# Altium footprint library SwagePCB.PcbLib: 114 footprints (part 4 of 8)
Each footprint in its own frame and in the unit in brackets; x right, y up, seen from the top. Pads: shape width x height; smd on the part's side, far side on the other; paste and mask are expansions set on the pad; w line width, h text height; cw(c..) or ccw(c..) is an arc to the next point about the centre after c.
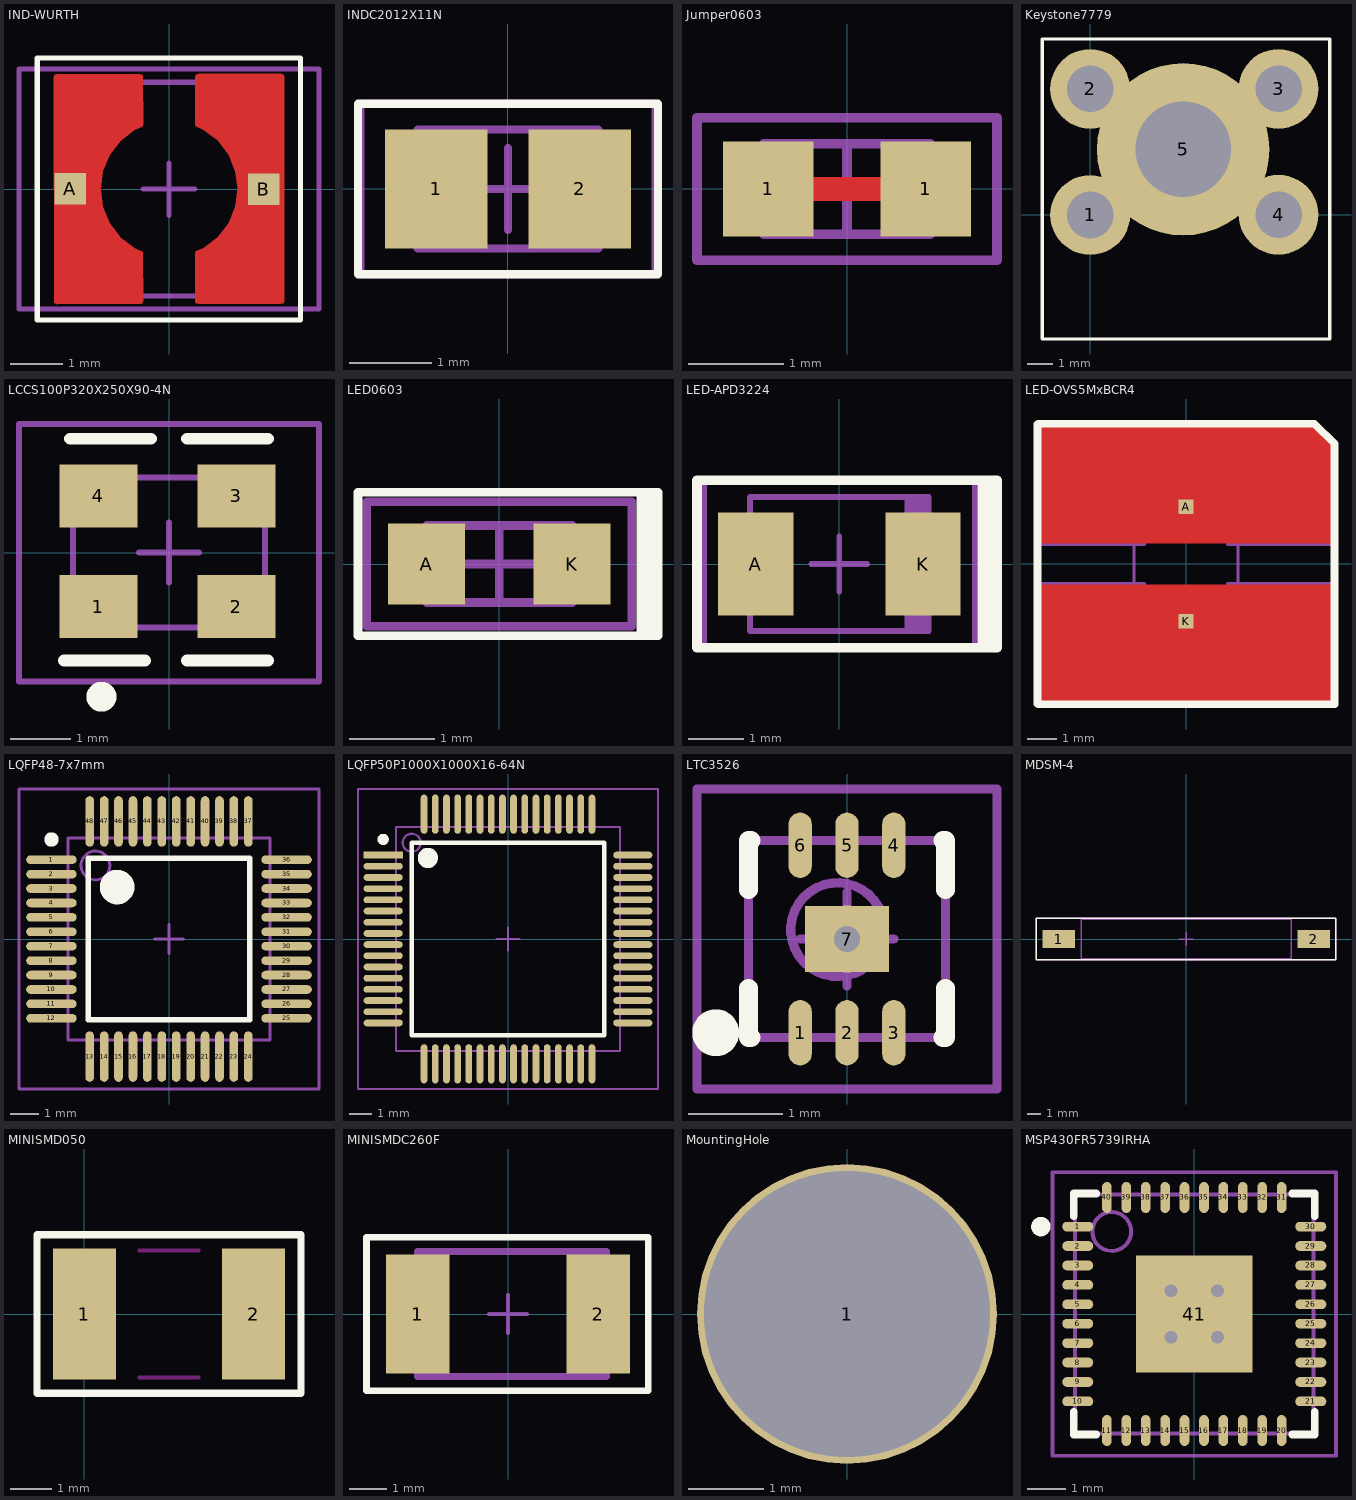
[diagram p3: the footprints below, top view; thin cyan lines are the x and y axes]

## IND-WURTH [mm] "Precision Wire Wound Inductor, 2-Leads, Body 3.8x3.8mm, IPC Medium Density"
height 1.8
pads (2):
  rect 0.6x0.6 smd: A(-1.894,0.006) B(1.818,0)
Top Layer:
  region: 0.505,-2.144 0.501,-1.228 0.517,-1.19 0.52,-1.193 0.517,-1.19 0.518,-1.189 0.536,-1.181 0.536,-1.182 0.661,-1.13 0.933,-0.922 1.141,-0.65 1.272,-0.334 1.317,0.006 1.272,0.345 1.141,0.661 0.933,0.933 0.661,1.141 0.536,1.193 0.517,1.2 0.501,1.24 0.505,1.24 0.501,2.156 0.517,2.195 0.556,2.211 0.556,2.207 2.155,2.211 2.194,2.195 2.195,2.195 2.194,2.195 2.195,2.194 2.195,2.195 2.192,2.191 2.191,2.192 2.195,2.195 2.194,2.195 2.195,2.194 2.195,2.195 2.192,2.191 2.195,2.194 2.211,2.155 2.207,2.155 2.211,-2.145 2.195,-2.184 2.156,-2.2 2.149,-2.197 2.149,-2.195 0.557,-2.2 0.517,-2.183 0.501,-2.144
  region: -2.201,-2.15 -2.205,2.15 -2.189,2.189 -2.186,2.186 -2.188,2.189 -2.149,2.206 -2.149,2.201 -0.55,2.206 -0.511,2.189 -0.494,2.15 -0.499,2.15 -0.494,1.234 -0.511,1.195 -0.529,1.187 -0.529,1.188 -0.654,1.136 -0.926,0.927 -1.134,0.656 -1.265,0.339 -1.31,0 -1.265,-0.339 -1.134,-0.656 -0.926,-0.927 -0.654,-1.136 -0.529,-1.187 -0.511,-1.195 -0.51,-1.196 -0.513,-1.198 -0.51,-1.196 -0.495,-1.234 -0.499,-1.234 -0.495,-2.15 -0.511,-2.189 -0.55,-2.205 -0.55,-2.201 -2.142,-2.203 -2.15,-2.206 -2.189,-2.19 -2.205,-2.15
Top Overlay:
  lines w0.1: -2.522,-2.507 2.521,-2.507 ; -2.522,2.512 2.521,2.512
  lines w0.102: -2.522,-2.507 -2.522,2.512 ; 2.521,-2.507 2.521,2.512
Mechanical 13:
  lines w0.1: -2.05,-2.05 -2.05,2.05 2.05,2.05 2.05,-2.05 -2.05,-2.05
Mechanical 15:
  lines w0.1: -0.5,0 0.5,0 ; 0,-0.5 0,0.5 ; -2.875,-2.3 -2.875,2.3 2.875,2.3 2.875,-2.3 -2.875,-2.3
3D body: height 1.8, standoff 0, extent -2.05,-2.05 2.05,2.05

## INDC2012X11N [mm] "Chip Inductor, 2-Leads, Body 2.0x1.3mm, IPC Medium Density"
height 1.1
pads (2):
  rect 1.25x1.45 smd: 1(-0.875,0) 2(0.875,0)
Top Overlay:
  lines w0.102: -1.829,-1.041 1.829,-1.041 1.829,1.041 -1.829,1.041 -1.829,-1.041
Mechanical 13:
  lines w0.1: -1.1,-0.725 -1.1,0.725 1.1,0.725 1.1,-0.725 -1.1,-0.725
Mechanical 15:
  lines w0.1: -1.778,1.041 1.778,1.041 ; -0.5,0 0.5,0 ; 0,-0.5 0,0.5
  lines w0.102: -1.803,-1.016 -1.803,1.016 ; -1.778,-1.041 1.778,-1.041 ; 1.803,-1.016 1.803,1.016
3D body: height 1.1, standoff 0, extent -1.1,-0.725 1.1,0.725

## Jumper0603 [mm] "Jumper made from an 0603 footprint"
pads (2):
  rect 0.95x1 smd: 1(-0.825,0) 1(0.825,0)
Top Layer:
  lines w0.254: -0.825,0 0.825,0
Mechanical 13:
  lines w0.1: -0.875,-0.475 0.875,-0.475 0.875,0.475 -0.875,0.475 -0.875,-0.475
Mechanical 15:
  lines w0.1: -0.475,0 0.475,0 ; 0,-0.475 0,0.475 ; -1.575,-0.75 1.575,-0.75 1.575,0.75 -1.575,0.75 -1.575,-0.75

## Keystone7779 [mil] "Screw Terminal, Right Angle"
height 279.53
pads (5):
  round 125 hole 73: 1(0,-0.47) 2(0,197) 3(295,197) 4(295,0)
  round 270 hole 150: 5(145.67,102.36)
Top Overlay:
  lines w5: 375.02,274.99 -75.04,275.02 -75.04,-194.61 375.06,-194.61 375.06,274.99
3D body: height 312, standoff -200, extent -56.39,-192.86 352.6,260.27

## LCCS100P320X250X90-4N [mm] "LCC, 4-Pins, Body 3.3x2.6mm (max), Pitch 1.00mm, IPC Medium Density"
height 0.9
pads (4):
  rect 1.3x1.05 smd: 1(-1.175,-0.9) 2(1.125,-0.9) 3(1.125,0.95) 4(-1.175,0.95)
Top Overlay:
  circle w0.25: c-1.125,-2.4 r0.125
  lines w0.2: -1.75,-1.8 -0.4,-1.8 ; -1.65,1.9 -0.3,1.9 ; 0.3,-1.8 1.65,-1.8 ; 0.3,1.9 1.65,1.9
Mechanical 13:
  lines w0.1: -1.6,-1.25 1.6,-1.25 1.6,1.25 -1.6,1.25 -1.6,-1.25
Mechanical 15:
  lines w0.1: -0.5,0 0.5,0 ; 0,-0.5 0,0.5 ; -2.5,-2.15 2.5,-2.15 2.5,2.15 -2.5,2.15 -2.5,-2.15
3D body: height 0.9, standoff 0, extent -1.6,-1.25 1.6,1.25

## LED0603 [mm] "Chip LED, 2-Leads, Body 1.7x0.8mm, IPC Medium Density"
height 0.65
pads (2):
  rect 0.9x0.95 smd: A(-0.85,0) K(0.85,0)
Top Overlay:
  lines w0.102: 1.753,-0.838 1.753,0.838 ; 1.651,-0.838 1.854,-0.838 1.854,0.838 1.651,0.838 ; 1.651,-0.838 1.651,0.838 ; 1.651,-0.838 -1.651,-0.838 -1.651,0.838 1.651,0.838
Mechanical 13:
  lines w0.1: -0.85,-0.45 0.85,-0.45 0.85,0.45 -0.85,0.45 -0.85,-0.45
Mechanical 15:
  lines w0.1: -0.45,0 0.45,0 ; 0,-0.45 0,0.45 ; -1.55,-0.725 1.55,-0.725 1.55,0.725 -1.55,0.725 -1.55,-0.725
3D body: height 0.55, standoff 0, extent -0.85,-0.45 0.85,0.45

## LED-APD3224 [mm] "LED, 2-Leads, Body 3.2x2.4mm, IPC Medium Density"
height 0.7
pads (2):
  rect 1.35x1.85 smd: A(-1.5,0) K(1.5,0)
Top Overlay:
  lines w0.178: 2.567,-1.499 2.567,1.499 ; 2.667,-1.499 2.667,1.499 ; 2.825,1.497 2.825,-1.5 -2.55,-1.5 -2.55,1.5 2.825,1.5
Mechanical 13:
  rectangle: 1.17,-1.2 1.6,1.2
  lines w0.1: -1.6,-1.2 -1.6,1.2 1.6,1.2 1.6,-1.2 -1.6,-1.2
Mechanical 15:
  lines w0.1: -0.5,0 0.5,0 ; 0,-0.5 0,0.5 ; -2.425,-1.5 -2.425,1.5 2.425,1.5 2.425,-1.5 -2.425,-1.5
3D body: height 0.7, standoff 0, extent -1.6,-1.2 1.6,1.2

## LED-OVS5MxBCR4 [mm] "LED, Water Clear Lens, 3.5mm x 3.5mm x 1.2mm"
height 1.2
pads (2):
  rect 0.5x0.5 smd paste+0 mask+0: A(0,1.925) K(0,-1.925)
Top Layer:
  region: -5,0.7 5,0.7 5,4.05 4.35,4.7 -5,4.7
  region: -5,-4.7 5,-4.7 5,-0.7 -5,-0.7
Top Layer keep-out:
  lines w0.127: -5,-0.381 -5,0.377 ; 4.978,-0.381 4.978,0.377
Top Overlay:
  lines w0.254: -5,-4.7 -5,4.7 -4.975,4.725 4.325,4.725 5,4.05 5,-4.725 -4.975,-4.725 -5,-4.7 ; 4.3,4.725 ccw(c4.3,4.725) 4.3,4.725
Top Paste:
  region: 1.4,-0.65 1.4,-2.2 -1.4,-2.2 -1.4,-0.65
  region: -1.4,0.65 -1.4,2.2 -0.25,2.2 0.25,2.2 1.4,2.2 1.4,0.65
Top Solder:
  region: -1.4,0.65 -1.4,3.175 1.4,3.175 1.4,0.65
  region: -1.4,-3.175 1.4,-3.175 1.4,-0.65 -1.4,-0.65
Mechanical 6:
  lines w0.102: 0.225,1.65 0.225,2.2 -0.25,2.2 -0.25,1.65 -1.4,1.65 -1.4,0.65 -5.05,0.65 -5.05,4.75 4.325,4.75 5.05,4.025 5.05,0.65 1.4,0.65 1.4,1.65 0.25,1.65 ; -5.05,-4.75 -5.05,-0.65 -1.4,-0.65 -1.4,-1.65 -0.225,-1.65 -0.225,-2.2 0.25,-2.2 0.25,-1.65 1.4,-1.65 1.4,-0.65 5.05,-0.65 5.05,-4.75 -5.05,-4.75
Mechanical 13:
  lines w0.102: -1.75,-1.75 1.75,-1.75 1.75,1.75 -1.75,1.75 -1.75,-1.75
3D body: height 1.2, standoff 0, extent -1.75,-1.75 1.75,1.75

## LQFP48-7x7mm [mm] "TSQFP, 48-Leads, Body 9.2x9.2mm (max), Pitch 0.50mm, IPC Medium Density"
height 1.6
pads (48):
  oval 1.75x0.3 smd: 1(-4.075,2.75) 2(-4.075,2.25) 3(-4.075,1.75) 4(-4.075,1.25) 5(-4.075,0.75) 6(-4.075,0.25) 7(-4.075,-0.25) 8(-4.075,-0.75) 9(-4.075,-1.25) 10(-4.075,-1.75) 11(-4.075,-2.25) 12(-4.075,-2.75) 25(4.075,-2.75) 26(4.075,-2.25) 27(4.075,-1.75) 28(4.075,-1.25) 29(4.075,-0.75) 30(4.075,-0.25) 31(4.075,0.25) 32(4.075,0.75) 33(4.075,1.25) 34(4.075,1.75) 35(4.075,2.25) 36(4.075,2.75)
  oval 0.3x1.75 smd: 13(-2.75,-4.075) 14(-2.25,-4.075) 15(-1.75,-4.075) 16(-1.25,-4.075) 17(-0.75,-4.075) 18(-0.25,-4.075) 19(0.25,-4.075) 20(0.75,-4.075) 21(1.25,-4.075) 22(1.75,-4.075) 23(2.25,-4.075) 24(2.75,-4.075) 37(2.75,4.075) 38(2.25,4.075) 39(1.75,4.075) 40(1.25,4.075) 41(0.75,4.075) 42(0.25,4.075) 43(-0.25,4.075) 44(-0.75,4.075) 45(-1.25,4.075) 46(-1.75,4.075) 47(-2.25,4.075) 48(-2.75,4.075)
Top Overlay:
  circle w0.6: c-1.8,1.8 r0.3
  circle w0.25: c-4.075,3.45 r0.125
  lines w0.2: -2.8,-2.8 2.8,-2.8 2.8,2.8 -2.8,2.8 -2.8,-2.8
Mechanical 13:
  circle w0.1: c-2.55,2.55 r0.5
  lines w0.1: -3.5,-3.5 3.5,-3.5 3.5,3.5 -3.5,3.5 -3.5,-3.5
Mechanical 15:
  lines w0.1: -0.5,0 0.5,0 ; 0,-0.5 0,0.5 ; -5.2,-5.2 5.2,-5.2 5.2,5.2 -5.2,5.2 -5.2,-5.2
3D body: height 1.6, standoff 0.05, extent -3.5,-3.5 3.5,3.5

## LQFP50P1000X1000X16-64N [mm] "LQFP, 64-Leads, Body 10x10mm (max), Pitch 0.50mm, IPC Medium Density"
height 1.6
pads (64):
  rect 1.75x0.3 smd: 1(-5.575,3.75)
  oval 1.75x0.3 smd: 2(-5.575,3.25) 3(-5.575,2.75) 4(-5.575,2.25) 5(-5.575,1.75) 6(-5.575,1.25) 7(-5.575,0.75) 8(-5.575,0.25) 9(-5.575,-0.25) 10(-5.575,-0.75) 11(-5.575,-1.25) 12(-5.575,-1.75) 13(-5.575,-2.25) 14(-5.575,-2.75) 15(-5.575,-3.25) 16(-5.575,-3.75) 33(5.575,-3.75) 34(5.575,-3.25) 35(5.575,-2.75) 36(5.575,-2.25) 37(5.575,-1.75) 38(5.575,-1.25) 39(5.575,-0.75) 40(5.575,-0.25) 41(5.575,0.25) 42(5.575,0.75) 43(5.575,1.25) 44(5.575,1.75) 45(5.575,2.25) 46(5.575,2.75) 47(5.575,3.25) 48(5.575,3.75)
  oval 0.3x1.75 smd: 17(-3.75,-5.575) 18(-3.25,-5.575) 19(-2.75,-5.575) 20(-2.25,-5.575) 21(-1.75,-5.575) 22(-1.25,-5.575) 23(-0.75,-5.575) 24(-0.25,-5.575) 25(0.25,-5.575) 26(0.75,-5.575) 27(1.25,-5.575) 28(1.75,-5.575) 29(2.25,-5.575) 30(2.75,-5.575) 31(3.25,-5.575) 32(3.75,-5.575) 49(3.75,5.575) 50(3.25,5.575) 51(2.75,5.575) 52(2.25,5.575) 53(1.75,5.575) 54(1.25,5.575) 55(0.75,5.575) 56(0.25,5.575) 57(-0.25,5.575) 58(-0.75,5.575) 59(-1.25,5.575) 60(-1.75,5.575) 61(-2.25,5.575) 62(-2.75,5.575) 63(-3.25,5.575) 64(-3.75,5.575)
Top Overlay:
  circle w0.25: c-5.575,4.45 r0.125
  circle w0.6: c-3.58,3.62 r0.15
  lines w0.2: -4.3,-4.3 -4.3,4.3 4.3,4.3 4.3,-4.3 -4.3,-4.3
Mechanical 13:
  circle w0.1: c-4.3,4.3 r0.4
  lines w0.1: -5,-5 -5,5 5,5 5,-5 -5,-5
Mechanical 15:
  lines w0.1: -0.5,0 0.5,0 ; 0,-0.5 0,0.5 ; -6.7,-6.7 -6.7,6.7 6.7,6.7 6.7,-6.7 -6.7,-6.7
3D body: height 1.6, standoff 0.15, extent -5,-5 5,5

## LTC3526 [mm] "QFN, 6-Leads, Pitch 0.50mm, IPC Medium Density"
height 0.8
pads (7):
  oval 0.25x0.7 smd: 1(-0.5,-1) 2(0,-1) 3(0.5,-1) 4(0.5,1) 5(0,1) 6(-0.5,1)
  rect 0.9x0.7 smd: 7(0,0)
via 0,0 diameter 0.711 hole 0.279
Top Overlay:
  circle w0.25: c-1.4,-1 r0.125
  lines w0.2: -1.05,-0.525 -1.05,-1.05 -1.025,-1.05 ; -1.05,0.525 -1.05,1.05 -1.025,1.05 ; 1.025,-1.05 1.05,-1.05 1.05,-0.525 ; 1.025,1.05 1.05,1.05 1.05,0.525
Mechanical 13:
  circle w0.1: c-0.1,0.1 r0.5
  lines w0.1: -1.05,-1.05 1.05,-1.05 1.05,1.05 -1.05,1.05 -1.05,-1.05
Mechanical 15:
  lines w0.1: -0.5,0 0.5,0 ; 0,-0.5 0,0.5 ; -1.6,-1.6 1.6,-1.6 1.6,1.6 -1.6,1.6 -1.6,-1.6
3D body: height 0.8, standoff 0.05, extent -1.05,-1.05 1.05,1.05

## MDSM-4 [mm] "Reed Switch, 2-Leads, Body 16x2.84mm, IPC Medium Density"
height 2.84
pads (2):
  rect 2.34x1.3 smd: 1(-9.17,0) 2(9.17,0)
Top Overlay:
  lines w0.1: -10.795,-1.5 -10.795,1.5 10.78,1.5 10.78,-1.5 -10.795,-1.5
Mechanical 13:
  lines w0.1: -7.545,-1.42 7.555,-1.42 7.555,1.42 -7.545,1.42 -7.545,-1.42
Mechanical 15:
  lines w0.1: -0.495,0 0.505,0 ; 0.005,-0.5 0.005,0.5 ; -10.795,-1.5 10.78,-1.5 10.78,1.5 -10.795,1.5 -10.795,-1.5
3D body: height 2.84, standoff 0, extent -7.545,-1.4 7.555,1.4

## MINISMD050 [mil] "Polyfuse,"
height 118.11
pads (2):
  rect 60x124 smd: 1(0,0) 2(160,0)
Top Layer keep-out:
  lines w4: 52,-60 108,-60 ; 52,60 108,60
Top Overlay:
  lines w7: -45,-75 205,-75 205,75 -45,75 -45,-75

## MINISMDC260F [mm] "Polyfuse, Body 45x32mm, Case 1812"
height 3
pads (2):
  rect 1.68x3.15 smd: 1(-2.39,0) 2(2.39,0)
Top Overlay:
  lines w0.178: -3.74,-2.032 3.71,-2.032 3.71,2.032 -3.74,2.032 -3.74,-2.032
Mechanical 15:
  lines w0.1: -0.5,0 0.5,0 ; 0,-0.5 0,0.5
  lines w0.178: -2.39,-1.65 2.61,-1.65 2.61,1.65 -2.39,1.65 ; -2.39,-1.65 -2.39,1.65 ; -2.39,-1.65 -2.39,1.65 ; -2.39,-1.65 -2.39,1.65
3D body: height 2.84, standoff 0, extent -2.39,-1.65 2.61,1.65

## MountingHole [mm] "PCB Mounting Hole, 0.150\" hole, 0.270\" Keepout"
pads (1):
  round 4 hole 3.81: 1(0,0)

## MSP430FR5739IRHA [mm] "QFN, 40-Leads, Body 6.2x6.2mm (max), Pitch 0.50mm, IPC Medium Density"
height 1
pads (41):
  oval 0.8x0.25 smd: 1(-3,2.25) 2(-3,1.75) 3(-3,1.25) 4(-3,0.75) 5(-3,0.25) 6(-3,-0.25) 7(-3,-0.75) 8(-3,-1.25) 9(-3,-1.75) 10(-3,-2.25) 21(3,-2.25) 22(3,-1.75) 23(3,-1.25) 24(3,-0.75) 25(3,-0.25) 26(3,0.25) 27(3,0.75) 28(3,1.25) 29(3,1.75) 30(3,2.25)
  oval 0.25x0.8 smd: 11(-2.25,-3) 12(-1.75,-3) 13(-1.25,-3) 14(-0.75,-3) 15(-0.25,-3) 16(0.25,-3) 17(0.75,-3) 18(1.25,-3) 19(1.75,-3) 20(2.25,-3) 31(2.25,3) 32(1.75,3) 33(1.25,3) 34(0.75,3) 35(0.25,3) 36(-0.25,3) 37(-0.75,3) 38(-1.25,3) 39(-1.75,3) 40(-2.25,3)
  rect 3x3 smd: 41(0,0)
via -0.6,0.6 diameter 0.66 hole 0.33
via 0.6,0.6 diameter 0.66 hole 0.33
via -0.6,-0.6 diameter 0.66 hole 0.33
via 0.6,-0.6 diameter 0.66 hole 0.33
Top Overlay:
  circle w0.25: c-3.95,2.25 r0.125
  lines w0.2: -3.1,-2.525 -3.1,-3.1 -2.525,-3.1 ; -3.1,2.525 -3.1,3.1 -2.525,3.1 ; 2.525,-3.1 3.1,-3.1 3.1,-2.525 ; 2.525,3.1 3.1,3.1 3.1,2.525
Mechanical 13:
  circle w0.1: c-2.125,2.125 r0.5
  lines w0.1: -3.075,-3.075 -3.075,3.075 3.075,3.075 3.075,-3.075 -3.075,-3.075
Mechanical 15:
  lines w0.1: -0.5,0 0.5,0 ; 0,-0.5 0,0.5 ; -3.65,-3.65 -3.65,3.65 3.65,3.65 3.65,-3.65 -3.65,-3.65
3D body: height 1, standoff 0.05, extent -3.075,-3.075 3.075,3.075